# Altium footprint library myPcbLib.PcbLib: 987 footprints (part 47 of 62)
Each footprint in its own frame and in the unit in brackets; x right, y up, seen from the top. Pads: shape width x height; smd on the part's side, far side on the other; paste and mask are expansions set on the pad; w line width, h text height; cw(c..) or ccw(c..) is an arc to the next point about the centre after c.
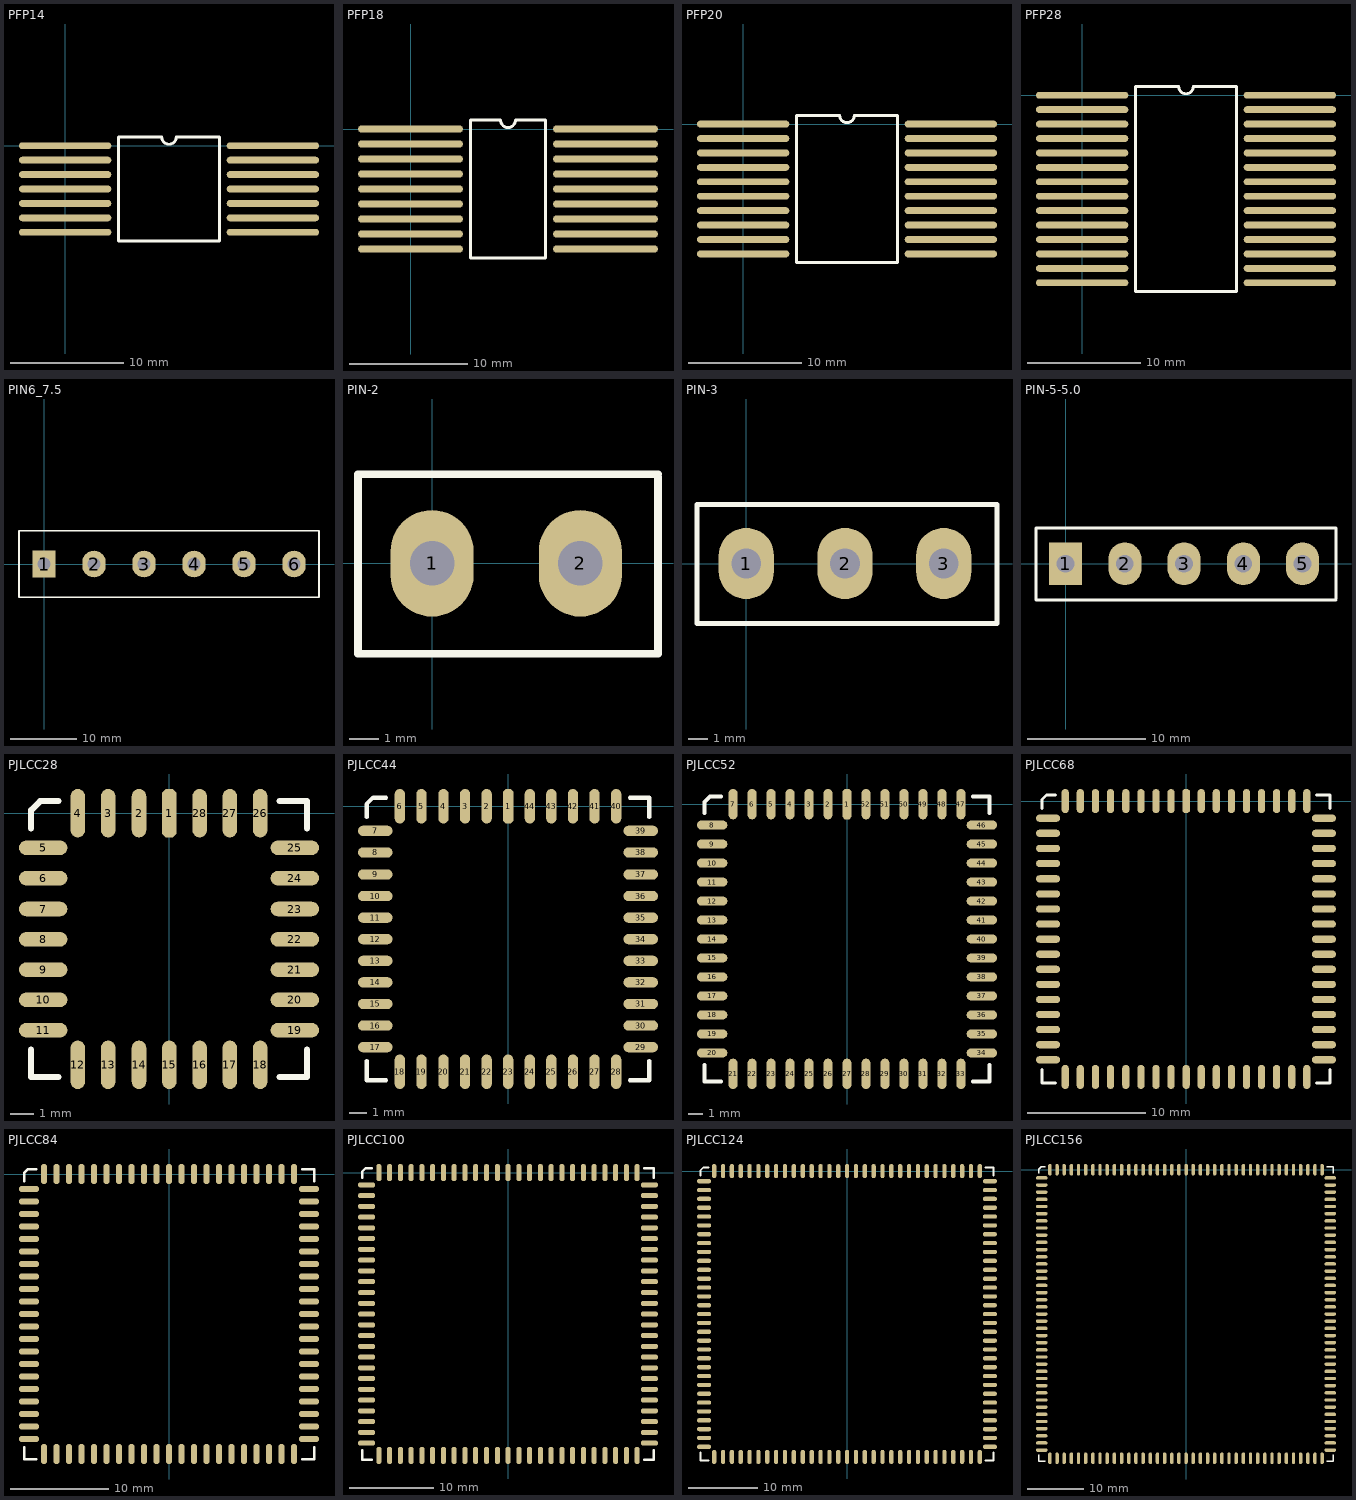
[diagram p46: the footprints below, top view; thin cyan lines are the x and y axes]

## PFP14 [mil]
pads (14):
  oval 320x24 smd: 1(0,0) 2(0,-50) 3(0,-100) 4(0,-150) 5(0,-200) 6(0,-250) 7(0,-300) 8(720,-300) 9(720,-250) 10(720,-200) 11(720,-150) 12(720,-100) 13(720,-50) 14(720,0)
Top Overlay:
  lines w10: 185,-330 535,-330 535,30 385,30 cw(c360,30) 335,30 185,30 185,-330

## PFP18 [mil]
pads (18):
  oval 350x24 smd: 1(0,0) 2(0,-50) 3(0,-100) 4(0,-150) 5(0,-200) 6(0,-250) 7(0,-300) 8(0,-350) 9(0,-400) 10(650,-400) 11(650,-350) 12(650,-300) 13(650,-250) 14(650,-200) 15(650,-150) 16(650,-100) 17(650,-50) 18(650,0)
Top Overlay:
  lines w10: 200,-430 200,30 300,30 ccw(c325,30) 350,30 450,30 450,-430 200,-430

## PFP20 [mil]
pads (20):
  oval 320x24 smd: 1(0,0) 2(0,-50) 3(0,-100) 4(0,-150) 5(0,-200) 6(0,-250) 7(0,-300) 8(0,-350) 9(0,-400) 10(0,-450) 11(720,-450) 12(720,-400) 13(720,-350) 14(720,-300) 15(720,-250) 16(720,-200) 17(720,-150) 18(720,-100) 19(720,-50) 20(720,0)
Top Overlay:
  lines w10: 185,-480 185,30 335,30 ccw(c360,30) 385,30 535,30 535,-480 185,-480

## PFP28 [mil]
pads (28):
  oval 320x24 smd: 1(0,0) 2(0,-50) 3(0,-100) 4(0,-150) 5(0,-200) 6(0,-250) 7(0,-300) 8(0,-350) 9(0,-400) 10(0,-450) 11(0,-500) 12(0,-550) 13(0,-600) 14(0,-650) 15(720,-650) 16(720,-600) 17(720,-550) 18(720,-500) 19(720,-450) 20(720,-400) 21(720,-350) 22(720,-300) 23(720,-250) 24(720,-200) 25(720,-150) 26(720,-100) 27(720,-50) 28(720,0)
Top Overlay:
  lines w10: 185,-680 185,30 335,30 ccw(c360,30) 385,30 535,30 535,-680 185,-680

## PIN6_7.5 [mm]
pads (6):
  rect 3.5x4 hole 2: 1(0,0)
  oval 3.5x4 hole 2: 2(7.5,0) 3(15,0) 4(22.5,0) 5(30,0) 6(37.5,0)
Top Overlay:
  lines w0.254: -3.75,-3.048 -3.75,3 ; -3.75,-2.5 -3.75,-5 7.62,-5 41.25,-5 41.25,3 41.25,5 39.475,5 -3.75,5 -3.75,2.75

## PIN-2 [mm]
pads (2):
  oval 2.8x3.6 hole 1.5: 1(0,0) 2(5,0)
Top Overlay:
  lines w0.254: -2.5,-3.048 7.62,-3.048 7.62,2.904 ; -2.5,-3 -2.5,3 7.62,3

## PIN-3 [mm]
pads (3):
  oval 2.8x3.6 hole 1.5: 1(0,0) 2(5,0) 3(10,0)
Top Overlay:
  lines w0.254: -2.5,-3.048 12.7,-3.048 ; -2.5,-3 -2.5,3 12.7,3 12.7,-2.952

## PIN-5-5.0 [mm]
height 5
pads (5):
  rect 2.8x3.6 hole 1.5: 1(0,0)
  oval 2.8x3.6 hole 1.5: 2(5,0) 3(10,0) 4(15,0) 5(20,0)
Top Overlay:
  lines w0.254: -2.5,-3.048 7.62,-3.048 22.82,-3.048 ; -2.5,-3 -2.5,3 7.62,3 22.82,3 22.82,-2.952

## PJLCC28 [mil]
pads (28):
  oct 24x80 smd: 1(0,0)
  oval 24x80 smd: 2(-50,0) 3(-101,0) 4(-151,0) 12(-151,-415) 13(-101,-415) 14(-50,-415) 15(0,-415) 16(50,-415) 17(100,-415) 18(150,-415) 26(150,0) 27(100,0) 28(50,0)
  oval 80x24 smd: 5(-208,-57) 6(-208,-107) 7(-208,-158) 8(-208,-208) 9(-208,-258) 10(-208,-308) 11(-208,-358) 19(207,-358) 20(207,-308) 21(207,-258) 22(207,-208) 23(207,-158) 24(207,-107) 25(207,-57)
Top Overlay:
  lines w10: -228,-390 -228,-435 -183,-435 ; -228,-25 -228,5 -213,20 -183,20 ; 182,-435 227,-435 227,-390 ; 182,20 227,20 227,-25

## PJLCC44 [mil]
pads (44):
  oct 24x80 smd: 1(0,0)
  oval 24x80 smd: 2(-50,0) 3(-100,0) 4(-150,0) 5(-201,0) 6(-251,0) 18(-251,-615) 19(-201,-615) 20(-150,-615) 21(-100,-615) 22(-50,-615) 23(0,-615) 24(50,-615) 25(100,-615) 26(150,-615) 27(200,-615) 28(250,-615) 40(250,0) 41(200,0) 42(150,0) 43(100,0) 44(50,0)
  oval 80x24 smd: 7(-308,-57) 8(-308,-107) 9(-308,-158) 10(-308,-208) 11(-308,-258) 12(-308,-308) 13(-308,-358) 14(-308,-408) 15(-308,-458) 16(-308,-508) 17(-308,-558) 29(307,-558) 30(307,-508) 31(307,-458) 32(307,-408) 33(307,-358) 34(307,-308) 35(307,-258) 36(307,-208) 37(307,-158) 38(307,-107) 39(307,-57)
Top Overlay:
  lines w10: -328,-590 -328,-635 -283,-635 ; -328,-25 -328,5 -313,20 -283,20 ; 282,-635 327,-635 327,-590 ; 282,20 327,20 327,-25

## PJLCC52 [mil]
pads (52):
  oct 24x80 smd: 1(0,0)
  oval 24x80 smd: 2(-50,0) 3(-100,0) 4(-150,0) 5(-200,0) 6(-250,0) 7(-300,0) 21(-300,-710) 22(-250,-710) 23(-200,-710) 24(-150,-710) 25(-100,-710) 26(-50,-710) 27(0,-710) 28(50,-710) 29(100,-710) 30(150,-710) 31(200,-710) 32(250,-710) 33(300,-710) 47(300,0) 48(250,0) 49(200,0) 50(150,0) 51(100,0) 52(50,0)
  oval 80x24 smd: 8(-355,-55) 9(-355,-105) 10(-355,-155) 11(-355,-205) 12(-355,-255) 13(-355,-305) 14(-355,-355) 15(-355,-405) 16(-355,-455) 17(-355,-505) 18(-355,-555) 19(-355,-605) 20(-355,-655) 34(355,-655) 35(355,-605) 36(355,-555) 37(355,-505) 38(355,-455) 39(355,-405) 40(355,-355) 41(355,-305) 42(355,-255) 43(355,-205) 44(355,-155) 45(355,-105) 46(355,-55)
Top Overlay:
  lines w10: -375,-687 -375,-730 -332,-730 ; -375,-23 -375,6 -361,20 -332,20 ; 332,-730 375,-730 375,-687 ; 332,20 375,20 375,-23

## PJLCC68 [mil]
pads (68):
  oct 24x80 smd: 1(0,0)
  oval 24x80 smd: 2(-50,0) 3(-100,0) 4(-150,0) 5(-200,0) 6(-251,0) 7(-301,0) 8(-351,0) 9(-401,0) 27(-401,-915) 28(-351,-915) 29(-301,-915) 30(-251,-915) 31(-200,-915) 32(-150,-915) 33(-100,-915) 34(-50,-915) 35(0,-915) 36(50,-915) 37(100,-915) 38(150,-915) 39(200,-915) 40(250,-915) 41(300,-915) 42(350,-915) 43(400,-915) 61(400,0) 62(350,0) 63(300,0) 64(250,0) 65(200,0) 66(150,0) 67(100,0) 68(50,0)
  oval 80x24 smd: 10(-458,-57) 11(-458,-107) 12(-458,-157) 13(-458,-207) 14(-458,-258) 15(-458,-308) 16(-458,-358) 17(-458,-408) 18(-458,-458) 19(-458,-508) 20(-458,-558) 21(-458,-608) 22(-458,-658) 23(-458,-708) 24(-458,-758) 25(-458,-808) 26(-458,-858) 44(457,-858) 45(457,-808) 46(457,-758) 47(457,-708) 48(457,-658) 49(457,-608) 50(457,-558) 51(457,-508) 52(457,-458) 53(457,-408) 54(457,-358) 55(457,-308) 56(457,-258) 57(457,-207) 58(457,-157) 59(457,-107) 60(457,-57)
Top Overlay:
  lines w10: -478,-890 -478,-935 -433,-935 ; -478,-25 -478,5 -463,20 -433,20 ; 432,-935 477,-935 477,-890 ; 432,20 477,20 477,-25

## PJLCC84 [mil]
pads (84):
  oct 24x80 smd: 1(0,0)
  oval 24x80 smd: 2(-50,0) 3(-100,0) 4(-150,0) 5(-200,0) 6(-250,0) 7(-300,0) 8(-350,0) 9(-400,0) 10(-450,0) 11(-500,0) 33(-500,-1120) 34(-450,-1120) 35(-400,-1120) 36(-350,-1120) 37(-300,-1120) 38(-250,-1120) 39(-200,-1120) 40(-150,-1120) 41(-100,-1120) 42(-50,-1120) 43(0,-1120) 44(50,-1120) 45(100,-1120) 46(150,-1120) 47(200,-1120) 48(250,-1120) 49(300,-1120) 50(350,-1120) 51(400,-1120) 52(450,-1120) 53(500,-1120) 75(500,0) 76(450,0) 77(400,0) 78(350,0) 79(300,0) 80(250,0) 81(200,0) 82(150,0) 83(100,0) 84(50,0)
  oval 80x24 smd: 12(-560,-60) 13(-560,-110) 14(-560,-160) 15(-560,-210) 16(-560,-260) 17(-560,-310) 18(-560,-360) 19(-560,-410) 20(-560,-460) 21(-560,-510) 22(-560,-560) 23(-560,-610) 24(-560,-660) 25(-560,-710) 26(-560,-760) 27(-560,-810) 28(-560,-860) 29(-560,-910) 30(-560,-960) 31(-560,-1010) 32(-560,-1060) 54(560,-1060) 55(560,-1010) 56(560,-960) 57(560,-910) 58(560,-860) 59(560,-810) 60(560,-760) 61(560,-710) 62(560,-660) 63(560,-610) 64(560,-560) 65(560,-510) 66(560,-460) 67(560,-410) 68(560,-360) 69(560,-310) 70(560,-260) 71(560,-210) 72(560,-160) 73(560,-110) 74(560,-60)
Top Overlay:
  lines w10: -580,-1092 -580,-1140 -532,-1140 ; -580,-28 -580,4 -564,20 -532,20 ; 532,-1140 580,-1140 580,-1092 ; 532,20 580,20 580,-28

## PJLCC100 [mil]
pads (100):
  oct 24x80 smd: 1(0,0)
  oval 24x80 smd: 2(-50,0) 3(-100,0) 4(-151,0) 5(-201,0) 6(-251,0) 7(-301,0) 8(-351,0) 9(-401,0) 10(-451,0) 11(-501,0) 12(-551,0) 13(-601,0) 39(-601,-1315) 40(-551,-1315) 41(-501,-1315) 42(-451,-1315) 43(-401,-1315) 44(-351,-1315) 45(-301,-1315) 46(-251,-1315) 47(-201,-1315) 48(-151,-1315) 49(-100,-1315) 50(-50,-1315) 51(0,-1315) 52(50,-1315) 53(100,-1315) 54(150,-1315) 55(200,-1315) 56(250,-1315) 57(300,-1315) 58(350,-1315) 59(400,-1315) 60(450,-1315) 61(500,-1315) 62(550,-1315) 63(600,-1315) 89(600,0) 90(550,0) 91(500,0) 92(450,0) 93(400,0) 94(350,0) 95(300,0) 96(250,0) 97(200,0) 98(150,0) 99(100,0) 100(50,0)
  oval 80x24 smd: 14(-658,-57) 15(-658,-107) 16(-658,-157) 17(-658,-207) 18(-658,-257) 19(-658,-307) 20(-658,-357) 21(-658,-407) 22(-658,-457) 23(-658,-507) 24(-658,-558) 25(-658,-608) 26(-658,-658) 27(-658,-708) 28(-658,-758) 29(-658,-808) 30(-658,-858) 31(-658,-908) 32(-658,-958) 33(-658,-1008) 34(-658,-1058) 35(-658,-1108) 36(-658,-1158) 37(-658,-1208) 38(-658,-1258) 64(657,-1258) 65(657,-1208) 66(657,-1158) 67(657,-1108) 68(657,-1058) 69(657,-1008) 70(657,-958) 71(657,-908) 72(657,-858) 73(657,-808) 74(657,-758) 75(657,-708) 76(657,-658) 77(657,-608) 78(657,-558) 79(657,-507) 80(657,-457) 81(657,-407) 82(657,-357) 83(657,-307) 84(657,-257) 85(657,-207) 86(657,-157) 87(657,-107) 88(657,-57)
Top Overlay:
  lines w10: -678,-1290 -678,-1335 -633,-1335 ; -678,-25 -678,5 -663,20 -633,20 ; 632,-1335 677,-1335 677,-1290 ; 632,20 677,20 677,-25

## PJLCC124 [mil]
pads (124):
  oct 24x80 smd: 1(0,0)
  oval 24x80 smd: 2(-50,0) 3(-100,0) 4(-150,0) 5(-200,0) 6(-250,0) 7(-301,0) 8(-351,0) 9(-401,0) 10(-451,0) 11(-501,0) 12(-551,0) 13(-601,0) 14(-651,0) 15(-701,0) 16(-751,0) 48(-751,-1615) 49(-701,-1615) 50(-651,-1615) 51(-601,-1615) 52(-551,-1615) 53(-501,-1615) 54(-451,-1615) 55(-401,-1615) 56(-351,-1615) 57(-301,-1615) 58(-250,-1615) 59(-200,-1615) 60(-150,-1615) 61(-100,-1615) 62(-50,-1615) 63(0,-1615) 64(50,-1615) 65(100,-1615) 66(150,-1615) 67(200,-1615) 68(250,-1615) 69(300,-1615) 70(350,-1615) 71(400,-1615) 72(450,-1615) 73(500,-1615) 74(550,-1615) 75(600,-1615) 76(650,-1615) 77(700,-1615) 78(750,-1615) 110(750,0) 111(700,0) 112(650,0) 113(600,0) 114(550,0) 115(500,0) 116(450,0) 117(400,0) 118(350,0) 119(300,0) 120(250,0) 121(200,0) 122(150,0) 123(100,0) 124(50,0)
  oval 80x24 smd: 17(-808,-57) 18(-808,-107) 19(-808,-157) 20(-808,-207) 21(-808,-257) 22(-808,-307) 23(-808,-357) 24(-808,-407) 25(-808,-457) 26(-808,-507) 27(-808,-558) 28(-808,-608) 29(-808,-658) 30(-808,-708) 31(-808,-758) 32(-808,-808) 33(-808,-858) 34(-808,-908) 35(-808,-958) 36(-808,-1008) 37(-808,-1058) 38(-808,-1108) 39(-808,-1158) 40(-808,-1208) 41(-808,-1258) 42(-808,-1308) 43(-808,-1358) 44(-808,-1408) 45(-808,-1458) 46(-808,-1508) 47(-808,-1558) 79(807,-1558) 80(807,-1508) 81(807,-1458) 82(807,-1408) 83(807,-1358) 84(807,-1308) 85(807,-1258) 86(807,-1208) 87(807,-1158) 88(807,-1108) 89(807,-1058) 90(807,-1008) 91(807,-958) 92(807,-908) 93(807,-858) 94(807,-808) 95(807,-758) 96(807,-708) 97(807,-658) 98(807,-608) 99(807,-558) 100(807,-507) 101(807,-457) 102(807,-407) 103(807,-357) 104(807,-307) 105(807,-257) 106(807,-207) 107(807,-157) 108(807,-107) 109(807,-57)
Top Overlay:
  lines w10: -828,-1590 -828,-1635 -783,-1635 ; -828,-25 -828,5 -813,20 -783,20 ; 782,-1635 827,-1635 827,-1590 ; 782,20 827,20 827,-25

## PJLCC156 [mil]
pads (156):
  oct 24x80 smd: 1(0,0)
  oval 24x80 smd: 2(-50,0) 3(-100,0) 4(-150,0) 5(-200,0) 6(-250,0) 7(-300,0) 8(-350,0) 9(-400,0) 10(-450,0) 11(-501,0) 12(-551,0) 13(-601,0) 14(-651,0) 15(-701,0) 16(-751,0) 17(-801,0) 18(-851,0) 19(-901,0) 20(-951,0) 60(-951,-2015) 61(-901,-2015) 62(-851,-2015) 63(-801,-2015) 64(-751,-2015) 65(-701,-2015) 66(-651,-2015) 67(-601,-2015) 68(-551,-2015) 69(-501,-2015) 70(-450,-2015) 71(-400,-2015) 72(-350,-2015) 73(-300,-2015) 74(-250,-2015) 75(-200,-2015) 76(-150,-2015) 77(-100,-2015) 78(-50,-2015) 79(0,-2015) 80(50,-2015) 81(100,-2015) 82(150,-2015) 83(200,-2015) 84(250,-2015) 85(300,-2015) 86(350,-2015) 87(400,-2015) 88(450,-2015) 89(500,-2015) 90(550,-2015) 91(600,-2015) 92(650,-2015) 93(700,-2015) 94(750,-2015) 95(800,-2015) 96(850,-2015) 97(900,-2015) 98(950,-2015) 138(950,0) 139(900,0) 140(850,0) 141(800,0) 142(750,0) 143(700,0) 144(650,0) 145(600,0) 146(550,0) 147(500,0) 148(450,0) 149(400,0) 150(350,0) 151(300,0) 152(250,0) 153(200,0) 154(150,0) 155(100,0) 156(50,0)
  oval 80x24 smd: 21(-1008,-57) 22(-1008,-107) 23(-1008,-157) 24(-1008,-207) 25(-1008,-257) 26(-1008,-307) 27(-1008,-357) 28(-1008,-407) 29(-1008,-457) 30(-1008,-507) 31(-1008,-558) 32(-1008,-608) 33(-1008,-658) 34(-1008,-708) 35(-1008,-758) 36(-1008,-808) 37(-1008,-858) 38(-1008,-908) 39(-1008,-958) 40(-1008,-1008) 41(-1008,-1058) 42(-1008,-1108) 43(-1008,-1158) 44(-1008,-1208) 45(-1008,-1258) 46(-1008,-1308) 47(-1008,-1358) 48(-1008,-1408) 49(-1008,-1458) 50(-1008,-1508) 51(-1008,-1558) 52(-1008,-1608) 53(-1008,-1658) 54(-1008,-1708) 55(-1008,-1758) 56(-1008,-1808) 57(-1008,-1858) 58(-1008,-1908) 59(-1008,-1958) 99(1007,-1958) 100(1007,-1908) 101(1007,-1858) 102(1007,-1808) 103(1007,-1758) 104(1007,-1708) 105(1007,-1658) 106(1007,-1608) 107(1007,-1558) 108(1007,-1508) 109(1007,-1458) 110(1007,-1408) 111(1007,-1358) 112(1007,-1308) 113(1007,-1258) 114(1007,-1208) 115(1007,-1158) 116(1007,-1108) 117(1007,-1058) 118(1007,-1008) 119(1007,-958) 120(1007,-908) 121(1007,-858) 122(1007,-808) 123(1007,-758) 124(1007,-708) 125(1007,-658) 126(1007,-608) 127(1007,-558) 128(1007,-507) 129(1007,-457) 130(1007,-407) 131(1007,-357) 132(1007,-307) 133(1007,-257) 134(1007,-207) 135(1007,-157) 136(1007,-107) 137(1007,-57)
Top Overlay:
  lines w10: -1028,-1990 -1028,-2035 -983,-2035 ; -1028,-25 -1028,5 -1013,20 -983,20 ; 982,-2035 1027,-2035 1027,-1990 ; 982,20 1027,20 1027,-25